# Altium footprint library My Library.PcbLib: 872 footprints (part 1 of 55)
Each footprint in its own frame and in the unit in brackets; x right, y up, seen from the top. Pads: shape width x height; smd on the part's side, far side on the other; paste and mask are expansions set on the pad; w line width, h text height; cw(c..) or ccw(c..) is an arc to the next point about the centre after c.
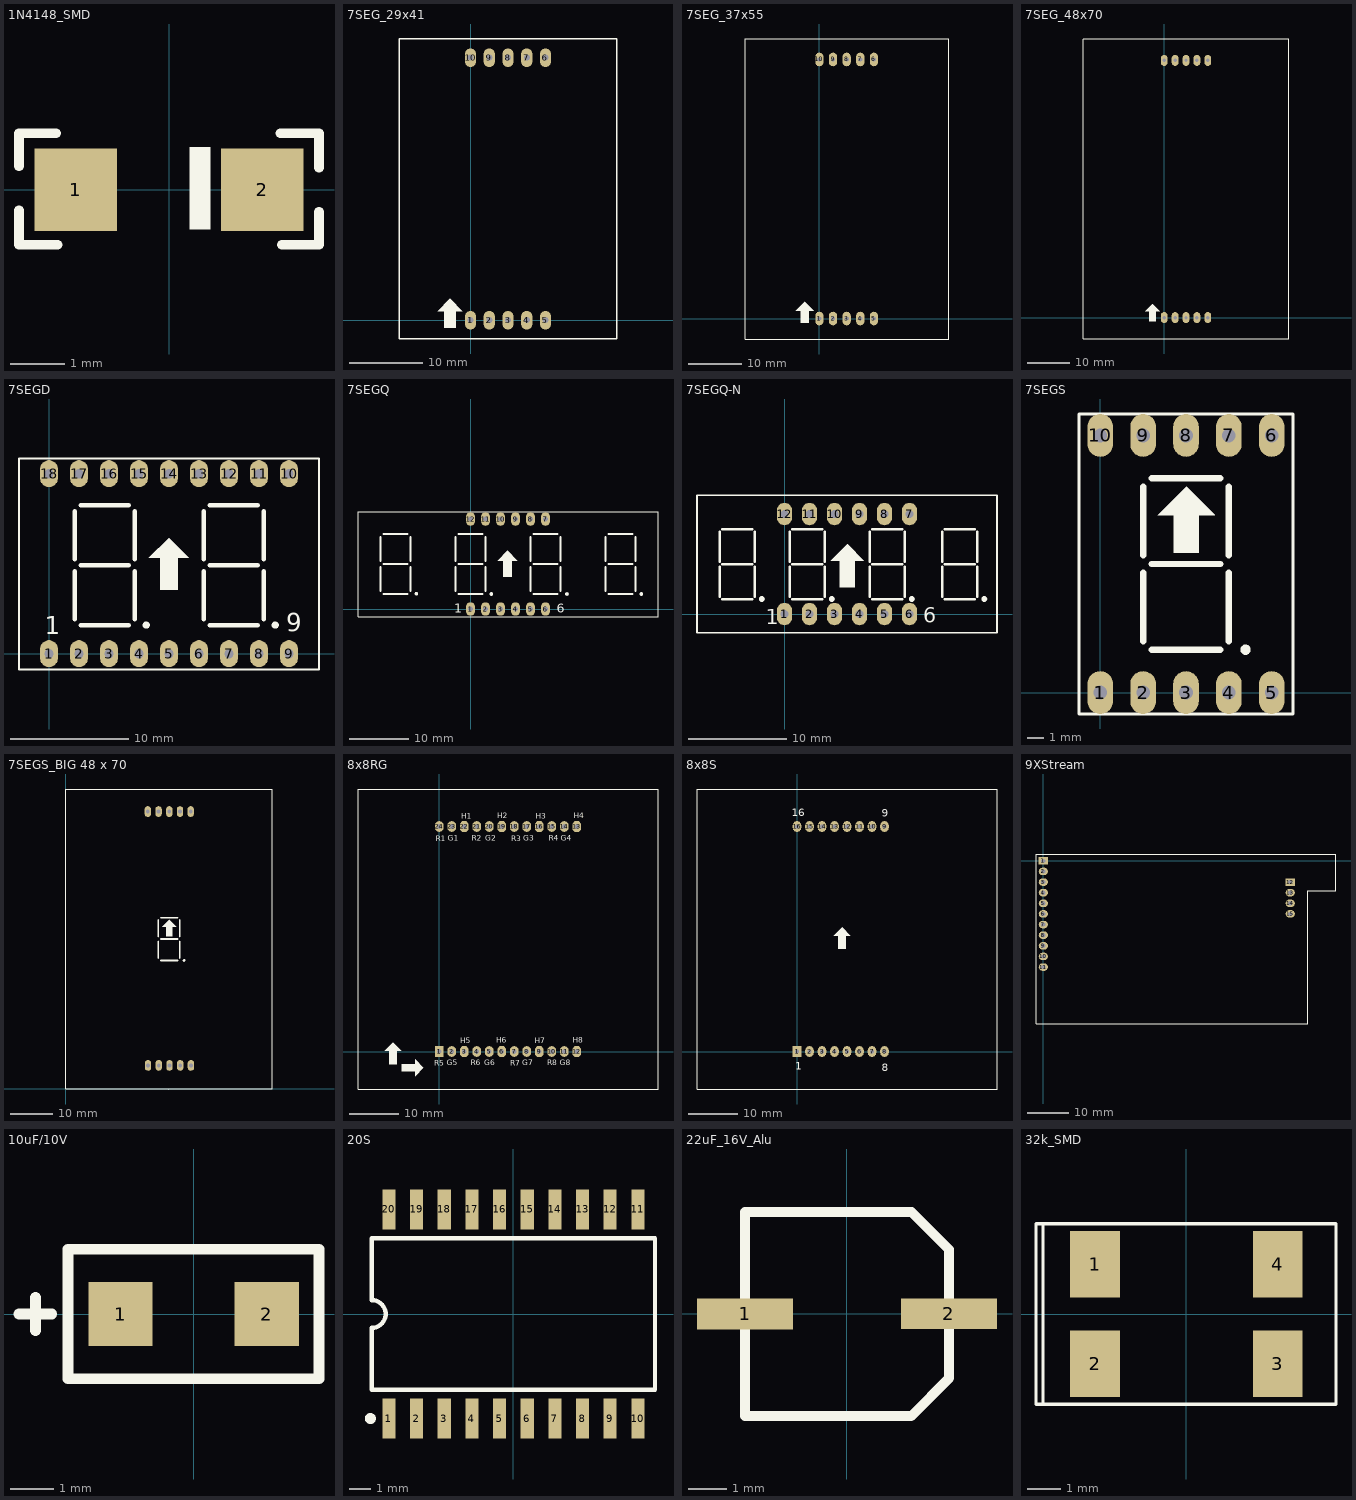
[diagram p0: the footprints below, top view; thin cyan lines are the x and y axes]

## 1N4148_SMD [mil]
pads (2):
  rect 60x60 smd: 1(-67.91,0) 2(67.91,0)
Top Overlay:
  region: 30,31 15,31 15,-29 30,-29
  lines w7: -109,-15 -109,-40 -81,-40 ; -109,17 -109,41 -82,41 ; 81,41 109,41 109,16 ; 82,-40 109,-40 109,-16
3D body: height 47.06, standoff 0, extent 55.11,-22.6 66.92,24.55
3D body: height 47.06, standoff 0, extent -70.88,-22.6 -59.07,24.55
3D body: height 45.1, standoff 1.97, extent -59.07,-20.63 31.48,22.59
3D body: height 45.1, standoff 1.97, extent 31.48,-20.63 43.3,22.59
3D body: height 45.1, standoff 1.97, extent 43.3,-20.63 55.11,22.59

## 7SEG_29x41 [mil] "DIP 10 Leads; Body 29 x 41 mm; Pitch 0.5 mm"
height 300
pads (10):
  oval 60x100 hole 32: 1(0,0) 2(100,0) 3(200,0) 4(300,0) 5(400,0) 6(400,1400) 7(300,1400) 8(200,1400) 9(100,1400) 10(0,1400)
Top Overlay:
  region: -176,48 -110,114 -108,114 -43,49 -43,48 -80,48 -80,-40 -139,-40 -139,48
  lines w7: -380,-100 -380,1500 780,1500 780,-100 -380,-100

## 7SEG_37x55 [mil] "DIP 10 Leads; Body 29 x 41 mm; Pitch 0.5 mm"
height 300
pads (10):
  oval 60x100 hole 32: 1(0,0) 2(100,0) 3(200,0) 4(300,0) 5(400,0) 6(400,1900) 7(300,1900) 8(200,1900) 9(100,1900) 10(0,1900)
Top Overlay:
  region: -174,56 -108,122 -106,122 -41,57 -41,56 -78,56 -78,-32 -137,-32 -137,56
  lines w7: -545,-150 950,-150 950,2050 -545,2050 -545,-150

## 7SEG_48x70 [mm] "DIP 10 Leads; Body 47,76 x 70mm; Pitch 0.5 mm"
height 7.62
pads (10):
  oval 1.6x2.54 hole 0.813: 1(0,0) 2(2.54,0) 3(5.08,0) 4(7.62,0) 5(10.16,0) 6(10.16,60) 7(7.62,60) 8(5.08,60) 9(2.54,60) 10(0,60)
Top Overlay:
  region: -4.42,1.422 -2.743,3.099 -2.692,3.099 -1.041,1.448 -1.041,1.422 -1.981,1.422 -1.981,-0.813 -3.48,-0.813 -3.48,1.422
  lines w0.178: -18.92,65 29.08,65 ; -18.92,-5 29.08,-5 -18.92,-5
  lines w0.203: -18.923,-4.928 -18.923,64.999 ; 29.058,-4.928 29.058,64.999

## 7SEGD [mil] "DIP 18Leads; Body 24 x 15 mm; Pitch 0.5 mm"
height 300
pads (18):
  oval 60x90 hole 31 paste+0: 1(0,0) 2(100,0) 3(200,0) 5(400,0) 6(500,0) 7(600,0) 8(700,0) 9(800,0) 10(800,600) 11(700,600) 12(600,600) 13(500,600) 14(400,600) 15(300,600) 16(200,600) 17(100,600) 18(0,600)
  oval 60x90 hole 31: 4(300,0)
Top Overlay:
  circle w12: c324,95 r6
  circle w12: c754,95 r6
  region: 333,319 399,385 401,385 466,320 466,319 429,319 429,213 370,213 370,319
  lines w7: -100,-52.5 -100,650 ; -100,-52.5 -100,650 ; -100,-52.5 -100,650 ; -100,-52.5 -100,650 ; -100,650 900,650 ; -100,650 900,650 ; -100,650 900,650 ; -100,650 900,650 ; 900,-52.5 900,650 ; 900,-52.5 900,650 ; 900,-52.5 -100,-52 900,-52.5 ; 900,-52.5 900,650 ; 900,-52.5 900,650
  lines w15: 85,115 85,275 ; 85,115 85,275 ; 85,115 85,275 ; 85,115 85,275 ; 85,115 85,275 ; 85,115 85,275 ; 85,115 85,275 ; 85,115 85,275 ; 85,315 85,475 ; 85,315 85,475 ; 85,315 85,475 ; 85,315 85,475 ; 85,315 85,475 ; 85,315 85,475 ; 85,315 85,475 ; 85,315 85,475 ; 105,95 265,95 ; 105,95 265,95 ; 105,95 265,95 ; 105,95 265,95 ; 105,295 265,295 ; 105,295 265,295 ; 105,295 265,295 ; 105,295 265,295 ; 105,295 265,295 ; 105,295 265,295 ; 105,295 265,295 ; 105,295 265,295 ; 105,495 265,495 ; 105,495 265,495 ; 105,495 265,495 ; 105,495 265,495 ; 285,115 285,275 ; 285,115 285,275 ; 285,115 285,275 ; 285,115 285,275 ; 285,115 285,275 ; 285,115 285,275 ; 285,115 285,275 ; 285,115 285,275 ; 285,315 285,475 ; 285,315 285,475 ; 285,315 285,475 ; 285,315 285,475 ; 285,315 285,475 ; 285,315 285,475 ; 285,315 285,475 ; 285,315 285,475 ; 515,115 515,275 ; 515,115 515,275 ; 515,115 515,275 ; 515,115 515,275 ; 515,115 515,275 ; 515,115 515,275 ; 515,115 515,275 ; 515,115 515,275 ; 515,315 515,475 ; 515,315 515,475 ; 515,315 515,475 ; 515,315 515,475 ; 515,315 515,475 ; 515,315 515,475 ; 515,315 515,475 ; 515,315 515,475 ; 535,95 695,95 ; 535,95 695,95 ; 535,95 695,95 ; 535,95 695,95 ; 535,295 695,295 ; 535,295 695,295 ; 535,295 695,295 ; 535,295 695,295 ; 535,295 695,295 ; 535,295 695,295 ; 535,295 695,295 ; 535,295 695,295 ; 535,495 695,495 ; 535,495 695,495 ; 535,495 695,495 ; 535,495 695,495 ; 715,115 715,275 ; 715,115 715,275 ; 715,115 715,275 ; 715,115 715,275 ; 715,115 715,275 ; 715,115 715,275 ; 715,115 715,275 ; 715,115 715,275 ; 715,315 715,475 ; 715,315 715,475 ; 715,315 715,475 ; 715,315 715,475 ; 715,315 715,475 ; 715,315 715,475 ; 715,315 715,475 ; 715,315 715,475
  text "9" at 790,75 h60
  text "1" at -14,65 h60
3D body "SW3dPS-atd-036ab.STEP": height 283.66, standoff -120, extent -24.88,30 864.88,585.12

## 7SEGQ [mil] "DIP 12 Leads; Body 48 x 20 mm; Pitch 0.5 mm"
height 300
pads (12):
  oval 60x90 hole 31: 1(0,0) 2(100,0) 3(200,0) 4(300,0) 5(400,0) 6(500,0) 7(500,600) 8(400,600) 9(300,600) 10(200,600) 11(100,600) 12(0,600)
Top Overlay:
  drawing of 155 lines, arcs and shapes, not listed
  text "6" at 575,-26 h60
  text "1" at -108,-24 h60
3D body "SOCKET6.stp": height 276.19, standoff -117.51, extent -50,550 550,650
3D body "SOCKET6.stp": height 276.19, standoff -117.51, extent -50,-44.99 550,55.01
3D body "7seg2-4.STEP": height 564.96, standoff 112.2, extent -720.16,-80 1260.16,668.03

## 7SEGQ-N [mil] "DIP 12 Leads; Body 32x 15 mm; Pitch 0.5 mm"
height 300
pads (12):
  oval 60x90 hole 31: 1(0,0) 2(100,0) 3(200,0) 4(300,0) 5(400,0) 6(500,0) 7(500,400) 8(400,400) 9(300,400) 10(200,400) 11(100,400) 12(0,400)
Top Overlay:
  circle w12: c509,60 r6
  circle w12: c799,60 r6
  circle w12: c-91,60 r6
  circle w12: c189,60 r6
  region: 184,213 250,279 252,279 317,214 317,213 280,213 280,107 221,107 221,213
  lines w7: -350,-75 -350,475 850,475 850,-75 -350,-75
  lines w10: -260,70 -260,190 ; -260,210 -260,330 ; -250,60 -130,60 ; -250,340 -130,340 ; -120,70 -120,190 ; -120,210 -120,330 ; 20,70 20,190 ; 20,210 20,330 ; 30,60 150,60 ; 30,340 150,340 ; 160,70 160,190 ; 160,210 160,330 ; 340,70 340,190 ; 340,210 340,330 ; 350,60 470,60 ; 350,340 470,340 ; 480,70 480,190 ; 480,210 480,330 ; 630,70 630,190 ; 630,210 630,330 ; 640,60 760,60 ; 640,340 760,340 ; 770,70 770,190 ; 770,210 770,330 ; -250,200 -130,200 -250,200 ; 30,200 150,200 30,200 ; 350,200 470,200 350,200 ; 640,200 760,200 640,200
  text "1" at -75,-40 h60
  text "6" at 555,-35 h60
3D body "SW3dPS-LTC-3710HR DISPLAY, 4-LED.STEP": height 238, standoff -98, extent -335.5,-70 865.5,450

## 7SEGS [mil] "DIP 10 Leads; Body 12 x 15 mm; Pitch 0.5 mm"
height 300
pads (10):
  oval 60x100 hole 32: 1(0,0) 2(100,0) 3(200,0) 4(300,0) 5(400,0) 6(400,600) 7(300,600) 8(200,600) 9(100,600) 10(0,600)
Top Overlay:
  circle w12: c339,100 r6
  region: 134,414 200,480 202,480 267,415 267,414 230,414 230,326 171,326 171,414
  lines w7: -50,-50 -50,650 450,650 450,-50 -50,-50
  lines w15: 100,120 100,280 ; 100,120 100,280 ; 100,120 100,280 ; 100,120 100,280 ; 100,120 100,280 ; 100,120 100,280 ; 100,120 100,280 ; 100,120 100,280 ; 100,320 100,480 ; 100,320 100,480 ; 100,320 100,480 ; 100,320 100,480 ; 100,320 100,480 ; 100,320 100,480 ; 100,320 100,480 ; 100,320 100,480 ; 120,100 280,100 ; 120,100 280,100 ; 120,100 280,100 ; 120,100 280,100 ; 120,300 280,300 ; 120,300 280,300 ; 120,300 280,300 ; 120,300 280,300 ; 120,300 280,300 ; 120,300 280,300 ; 120,300 280,300 ; 120,300 280,300 ; 120,500 280,500 ; 120,500 280,500 ; 120,500 280,500 ; 120,500 280,500 ; 300,120 300,280 ; 300,120 300,280 ; 300,120 300,280 ; 300,120 300,280 ; 300,120 300,280 ; 300,120 300,280 ; 300,120 300,280 ; 300,120 300,280 ; 300,320 300,480 ; 300,320 300,480 ; 300,320 300,480 ; 300,320 300,480 ; 300,320 300,480 ; 300,320 300,480 ; 300,320 300,480 ; 300,320 300,480
3D body "SW3dPS-Disp_SA56-11.STEP": height 316.25, standoff -156.19, extent -50,-75 450,675

## 7SEGS_BIG 48 x 70 [mil] "7SEGS_BIG 48 x 70"
pads (10):
  oval 60x100 hole 35.43: 1(769,219) 2(869,219) 3(969,219) 4(1069,219) 5(1169,219) 6(1167,2585) 7(1067,2585) 8(967,2585) 9(867,2585) 10(767,2585)
Top Overlay:
  circle w12: c1105,1197 r6
  region: 900,1511 966,1577 968,1577 1033,1512 1033,1511 996,1511 996,1423 937,1423 937,1511
  lines w10: 1,1397.5 1.14,1397.64 ; 1,1398 1.36,1397.64 ; 963,1397 964,1396 964,1394 ; 964,-1 964.57,-0.43 ; 0,0 1929.13,0 1929.13,2795.28 0,2795.28 0,0
  lines w15: 866,1217 866,1377 ; 866,1217 866,1377 ; 866,1217 866,1377 ; 866,1217 866,1377 ; 866,1217 866,1377 ; 866,1217 866,1377 ; 866,1217 866,1377 ; 866,1217 866,1377 ; 866,1417 866,1577 ; 866,1417 866,1577 ; 866,1417 866,1577 ; 866,1417 866,1577 ; 866,1417 866,1577 ; 866,1417 866,1577 ; 866,1417 866,1577 ; 866,1417 866,1577 ; 886,1197 1046,1197 ; 886,1197 1046,1197 ; 886,1197 1046,1197 ; 886,1197 1046,1197 ; 886,1397 1046,1397 ; 886,1397 1046,1397 ; 886,1397 1046,1397 ; 886,1397 1046,1397 ; 886,1397 1046,1397 ; 886,1397 1046,1397 ; 886,1397 1046,1397 ; 886,1397 1046,1397 ; 886,1597 1046,1597 ; 886,1597 1046,1597 ; 886,1597 1046,1597 ; 886,1597 1046,1597 ; 1066,1217 1066,1377 ; 1066,1217 1066,1377 ; 1066,1217 1066,1377 ; 1066,1217 1066,1377 ; 1066,1217 1066,1377 ; 1066,1217 1066,1377 ; 1066,1217 1066,1377 ; 1066,1217 1066,1377 ; 1066,1417 1066,1577 ; 1066,1417 1066,1577 ; 1066,1417 1066,1577 ; 1066,1417 1066,1577 ; 1066,1417 1066,1577 ; 1066,1417 1066,1577 ; 1066,1417 1066,1577 ; 1066,1417 1066,1577
3D body: height 472.83, standoff 19.68, extent 1,1 1928,2794
3D body: height 472.44, standoff 3.94, extent 0,0 1929.13,2795.28
3D body: height 196.85, standoff -196.85, extent 1151.43,201.33 1186.72,236.69
3D body: height 196.85, standoff -196.85, extent 1051.43,201.33 1086.72,236.69
3D body: height 196.85, standoff -196.85, extent 951.43,201.33 986.72,236.69
3D body: height 196.85, standoff -196.85, extent 851.43,201.33 886.72,236.69
3D body: height 196.85, standoff -196.85, extent 751.43,201.33 786.72,236.69
3D body: height 196.85, standoff -196.85, extent 1149.43,2567.33 1184.72,2602.69
3D body: height 196.85, standoff -196.85, extent 1049.43,2567.33 1084.72,2602.69
3D body: height 196.85, standoff -196.85, extent 949.43,2567.33 984.72,2602.69
3D body: height 196.85, standoff -196.85, extent 849.43,2567.33 884.72,2602.69
3D body: height 196.85, standoff -196.85, extent 749.43,2567.32 784.72,2602.68

## 8x8RG [mil] "Matran 8x8 2mau,Body 60 X 60mm"
height 300
pads (24):
  rect 70x85 hole 37.4: 1(0,0)
  oval 70x85 hole 37.4: 2(100,0) 4(300,0) 5(400,0) 7(600,0) 8(700,0) 10(900,0) 11(1000,0) 14(1000,1800) 15(900,1800) 17(700,1800) 18(600,1800) 20(400,1800) 21(300,1800) 23(100,1800) 24(0,1800)
  oct 70x85 hole 37.4: 3(200,0) 6(500,0) 9(800,0) 12(1100,0) 13(1100,1800) 16(800,1800) 19(500,1800) 22(200,1800)
Top Overlay:
  region: -437,5 -371,71 -369,71 -304,6 -304,5 -341,5 -341,-101 -400,-101 -400,5
  region: -193,-63 -127,-129 -127,-131 -192,-196 -193,-196 -193,-159 -299,-159 -299,-100 -193,-100
  lines w7: -650,-300 1750,-300 ; -650,-300 -650,2100 ; -650,-300 -650,2100 ; -650,2100 1750,2100 ; 1750,-300 1750,2100 ; 1750,-300 1750,2100
  text "R8" at 863,-111 h45
  text "G8" at 962,-110 h45
  text "H8" at 1068,69 h45
  text "R7" at 568,-112 h45
  text "G7" at 664,-111 h45
  text "H7" at 765,68 h45
  text "R6" at 250,-111 h45
  text "G6" at 358,-111 h45
  text "H6" at 456,69 h45
  text "H5" at 166,68 h45
  text "G5" at 60,-111 h45
  text "R5" at -40,-112 h45
  text "R1" at -28,1684 h45
  text "G1" at 68,1685 h45
  text "H1" at 174,1864 h45
  text "H2" at 464,1865 h45
  text "G2" at 366,1685 h45
  text "R2" at 258,1685 h45
  text "H3" at 773,1864 h45
  text "G3" at 672,1685 h45
  text "R3" at 576,1684 h45
  text "H4" at 1076,1865 h45
  text "G4" at 970,1686 h45
  text "R4" at 874,1685 h45
Bottom Overlay:
  text "R8" at 932,-111 h45
  text "G8" at 1031,-110 h45
  text "H8" at 1137,69 h45
  text "R7" at 637,-112 h45
  text "G7" at 733,-111 h45
  text "H7" at 834,68 h45
  text "R6" at 319,-111 h45
  text "G6" at 427,-111 h45
  text "H6" at 525,69 h45
  text "H5" at 235,68 h45
  text "G5" at 129,-111 h45
  text "R5" at 29,-112 h45
  text "R1" at 41,1684 h45
  text "G1" at 137,1685 h45
  text "H1" at 243,1864 h45
  text "H2" at 533,1865 h45
  text "G2" at 435,1685 h45
  text "R2" at 327,1685 h45
  text "H3" at 842,1864 h45
  text "G3" at 741,1685 h45
  text "R3" at 645,1684 h45
  text "H4" at 1145,1865 h45
  text "G4" at 1039,1686 h45
  text "R4" at 943,1685 h45

## 8x8S [mil] "Matran 8x8, Body 60 X 60mm"
height 300
pads (16):
  rect 70x85 hole 31: 1(0,0)
  oval 70x85 hole 31: 2(100,0) 3(200,0) 4(300,0) 5(400,0) 6(500,0) 7(600,0) 8(700,0) 9(700,1800) 10(600,1800) 11(500,1800) 12(400,1800) 13(300,1800) 14(200,1800) 15(100,1800) 16(0,1800)
Top Overlay:
  region: 294,927 360,993 362,993 427,928 427,927 390,927 390,821 331,821 331,927
  lines w7: -800,-300 -800,2100 ; -800,-300 -800,2100 ; -800,-300 1600,-300 ; -800,-300 1600,-300 ; -800,2100 1600,2100 ; -800,2100 1600,2100 ; 1600,-300 1600,2100 ; 1600,-300 1600,2100
  text "16" at -42,1881 h60
  text "9" at 679,1880 h60
  text "8" at 678,-156 h60
  text "1" at -15,-144 h60

## 9XStream [mm] "RF Module"
height 12
pads (15):
  rect 2.2x1.8 hole 1: 1(0,0) 12(59.055,-5.08)
  oval 2.2x1.8 hole 1: 2(0,-2.54) 3(0,-5.08) 4(0,-7.62) 5(0,-10.16) 6(0,-12.7) 7(0,-15.24) 8(0,-17.78) 9(0,-20.32) 10(0,-22.86) 11(0,-25.4) 13(59.055,-7.62) 14(59.055,-10.16) 15(59.055,-12.7)
Top Overlay:
  lines w0.025: -1.753,1.626 -1.575,1.626
  lines w0.1: -1.753,-39.014 63.271,-39.014 63.271,-7.137 70.002,-7.137 70.002,1.626 -1.753,1.626 -1.753,-39.014
3D body: height 15, standoff 11, extent 26.67,-37.592 56.896,0
3D body: height 11, standoff 10, extent -1.753,-39.014 70.002,1.626
3D body: height 10, standoff 1, extent -1.575,-26.67 1.524,1.27
3D body: height 10, standoff 1, extent 57.658,-13.97 60.452,-3.81

## 10uF/10V [mm]
pads (2):
  rect 1.5x1.5 smd: 1(-1.7,0) 2(1.7,0)
Top Overlay:
  lines w0.254: -4.064,0 -3.302,0 ; -3.683,-0.381 -3.683,0.381 ; -2.921,-1.508 -2.921,1.508 2.921,1.508 2.921,-1.508 -2.921,-1.508
3D body: height 1.5, standoff 0, extent -1.905,-1 1.905,1
3D body: height 1.51, standoff 1.5, extent -1.778,-1 -1.524,1
3D body: height 0.8, standoff 0, extent -2.032,-0.635 -1.905,0.635
3D body: height 0.8, standoff 0, extent 1.905,-0.635 2.032,0.635

## 20S [mm] "Small Outline; 20 Leads; Body Width 7.5 mm; Pitch 1.27 mm"
height 2.67
pads (20):
  rect 0.6x1.85 smd: 1(-5.715,-4.8) 2(-4.445,-4.8) 3(-3.175,-4.8) 4(-1.905,-4.8) 5(-0.635,-4.8) 6(0.635,-4.8) 7(1.905,-4.8) 8(3.175,-4.8) 9(4.445,-4.8) 10(5.715,-4.8) 11(5.715,4.8) 12(4.445,4.8) 13(3.175,4.8) 14(1.905,4.8) 15(0.635,4.8) 16(-0.635,4.8) 17(-1.905,4.8) 18(-3.175,4.8) 19(-4.445,4.8) 20(-5.715,4.8)
Top Overlay:
  circle w0.25: c-6.565,-4.8 r0.125
  lines w0.2: -6.5,-3.475 -6.5,-0.635 ccw(c-6.5,0) -6.5,0.635 -6.5,3.475 6.5,3.475 6.5,-3.475 -6.5,-3.475

## 22uF_16V_Alu [mm] "Case code C"
pads (2):
  rect 2.5x0.8 smd: 1(-2.654,-0.002) 2(2.655,0.002)
Top Overlay:
  lines w0.254: -2.651,-2.659 -2.654,-2.656 ; -2.654,-2.656 -2.654,2.653 1.681,2.653 2.655,1.679 2.655,-1.675 1.674,-2.656 -2.654,-2.656
3D body: height 0.2, standoff 0, extent 1.532,-0.294 3.564,0.316
3D body: height 5.45, standoff 0.3, extent -2.629,-2.646 2.65,2.643
3D body: height 1, standoff 0.1, extent -2.654,-2.656 2.655,2.653
3D body: height 5.5, standoff 0.3, extent 1.1,-2.377 2.523,2.449
3D body: height 0.2, standoff 0, extent -3.539,-0.315 -1.507,0.294

## 32k_SMD [mm]
pads (4):
  rect 1.5x2 smd: 1(-2.75,1.5) 2(-2.75,-1.5) 3(2.75,-1.5) 4(2.75,1.5)
Top Overlay:
  lines w0.102: -4.531,-2.718 -4.531,2.718 4.505,2.718 4.505,-2.718 -4.505,-2.718 ; -4.318,-2.718 -4.318,2.718
3D body: height 0.2, standoff 0, extent -3.189,1.245 -2.325,1.778
3D body: height 0.2, standoff 0, extent 2.311,1.245 3.175,1.778
3D body: height 0.2, standoff 0, extent 2.325,-1.778 3.189,-1.245
3D body: height 0.2, standoff 0, extent -3.175,-1.778 -2.311,-1.245
3D body: height 2.2, standoff 0, extent -4,-1.5 4,1.5